# Altium footprint library Intelliclone.PcbLib: 372 footprints (part 7 of 24)
Each footprint in its own frame and in the unit in brackets; x right, y up, seen from the top. Pads: shape width x height; smd on the part's side, far side on the other; paste and mask are expansions set on the pad; w line width, h text height; cw(c..) or ccw(c..) is an arc to the next point about the centre after c.
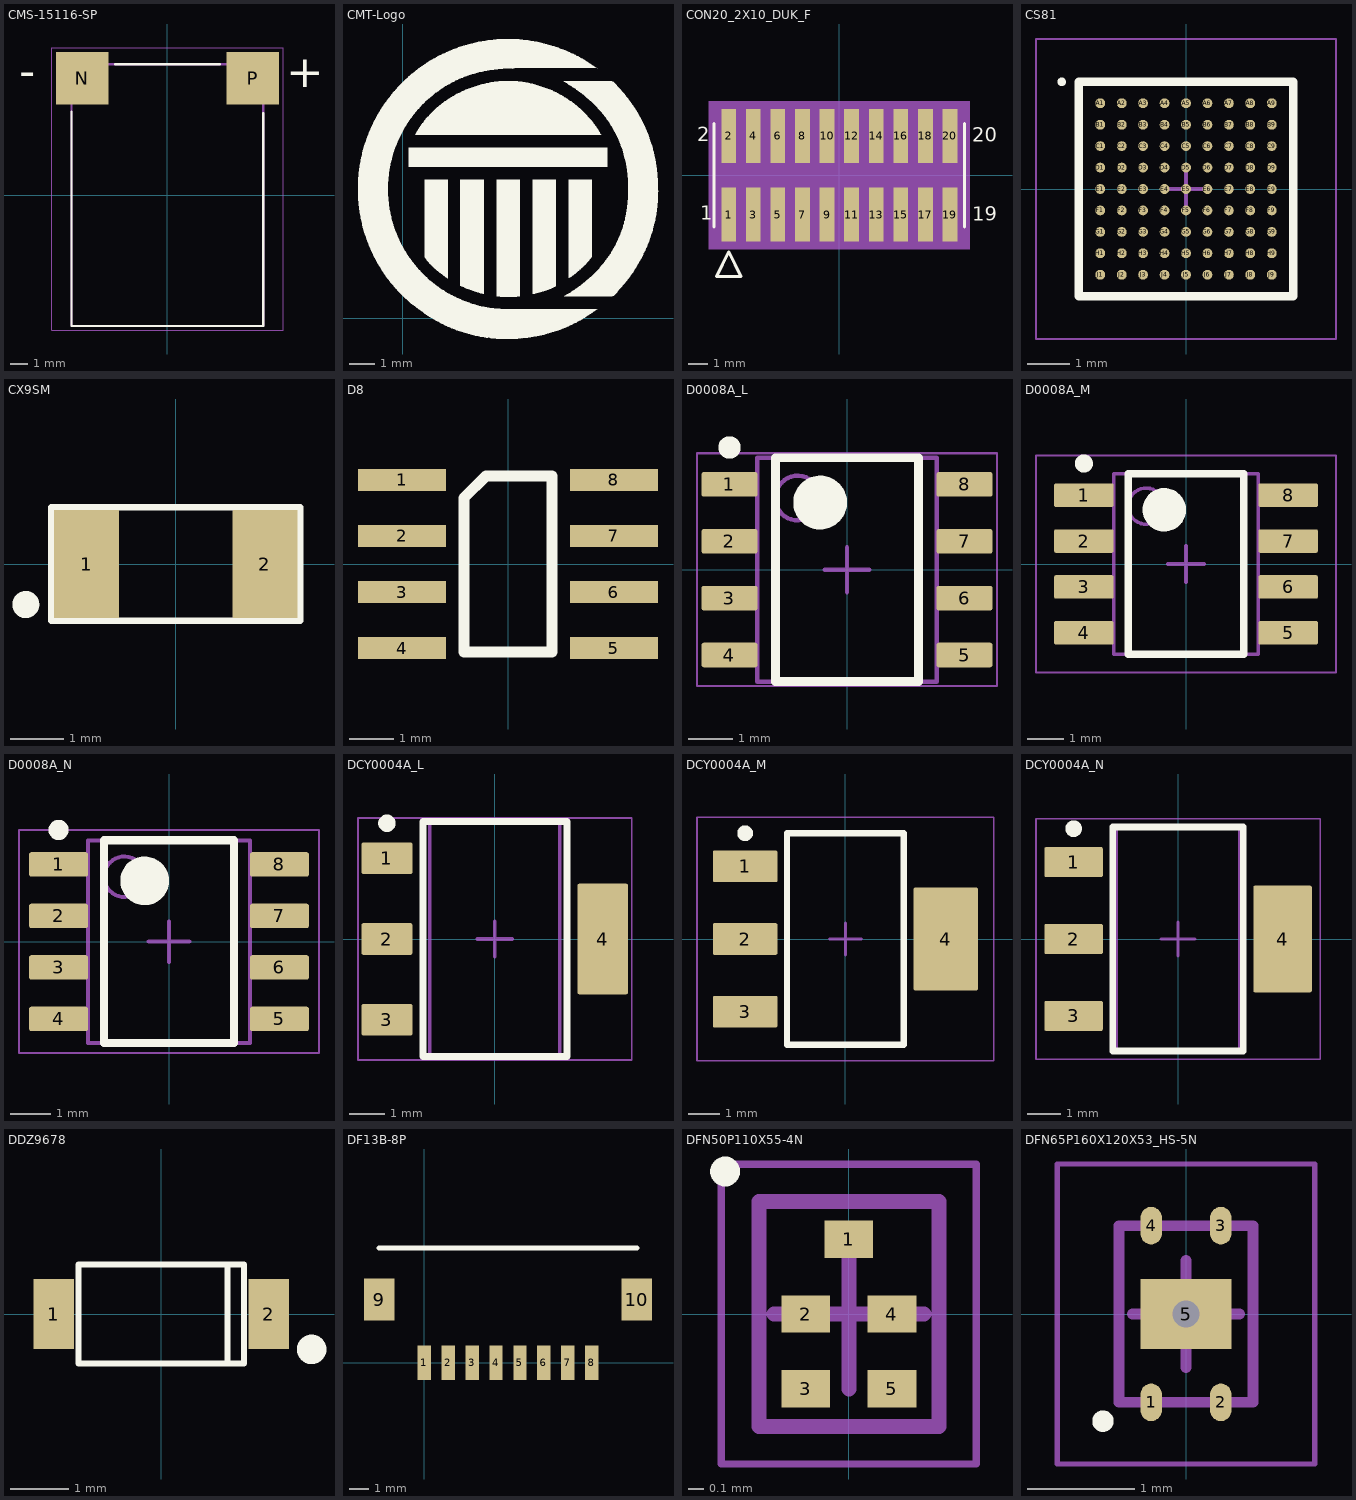
[diagram p6: the footprints below, top view; thin cyan lines are the x and y axes]

## CMS-15116-SP [mm] "SPEAKER, 15 X 11 MM, 3 MM DEEP"
pads (2):
  rect 3x3 smd paste-100: N(-4.89,6.7) P(4.89,6.7)
Top Overlay:
  lines w0.127: -5.5,4.8 -5.5,-7.5 5.5,-7.5 5.5,4.7 ; -3,7.5 3,7.5
  text "+" at 6.817,6.196 h1.88
  text "-" at -8.509,6.223 h1.88
Mechanical 4:
  lines w0.127: -5.5,-7.5 5.5,-7.5 ; -5.5,-7.5 -5.5,7.5 ; -5.5,-7.5 5.5,-7.5 ; -5.5,-7.5 -5.5,7.5 ; -5.5,7.5 5.5,7.5 ; -5.5,7.5 5.5,7.5 ; 5.5,-7.5 5.5,7.5 ; 5.5,-7.5 5.5,7.5
Mechanical 16:
  lines w0.05: -6.64,-7.75 6.64,-7.75 6.64,8.45 -6.64,8.45 -6.64,-7.75
3D body "CUI_CMS-15116-SP.step": height 3, standoff -0.23, extent -5.539,-7.493 5.461,7.507
3D body: height 1.45, standoff 0, extent -2.032,-0.635 -2.032,-0.635

## CMT-Logo [mm] "SBT DXF logo"
Top Overlay:
  drawing of 19 lines, arcs and shapes, not listed

## CON20_2X10_DUK_F [mil]
pads (20):
  rect 30x110 smd paste+0 mask+0: 1(-225,-80) 2(-225,80) 3(-175,-80) 4(-175,80) 5(-125,-80) 6(-125,80) 7(-75,-80) 8(-75,80) 9(-25,-80) 10(-25,80) 11(25,-80) 12(25,80) 13(75,-80) 14(75,80) 15(125,-80) 16(125,80) 17(175,-80) 18(175,80) 19(225,-80) 20(225,80)
Top Overlay:
  region: -220,-107.5 -230,-107.5 -230,-122.5 -220,-122.5
  region: 30,-107.5 20,-107.5 20,-122.5 30,-122.5
  lines w6: -255,-105 -255,105 ; 255,-105 255,105 ; -249.8,-205.97 -199.8,-205.97 -224.8,-155.97 -249.8,-205.97
  text "19" at 270.63,-103.03 h50
  text "20" at 270.63,57.95 h50
  text "1" at -283.15,-101.06 h50
  text "2" at -289.37,59.06 h50
Mechanical 5:
  region: 265,-150 -265,-150 -265,150 265,150
Mechanical 13:
  lines w1: -250,-100 -250,100 250,100 250,-100 -250,-100 ; -249.8,-205.97 -199.8,-205.97 -224.8,-155.97 -249.8,-205.97
  text "19" at 272.64,-100.39 h50
  text "20" at 272.64,57.95 h50
  text "1" at -283.15,-101.06 h50
  text "2" at -288.39,58.07 h50
Mechanical 15:
  region: 250,-100 -250,-100 -250,100 250,100
  region: -233,-100 -250,-100 -250,100 -233,100 -233,135 233,135 233,100 250,100 250,-100 233,-100 233,-135 -233,-135
  lines w6: -250,-100 -233,-100 -233,-135 233,-135 233,-100 250,-100 250,100 233,100 233,135 -233,135 -233,100 -250,100 -250,-100
3D body: height 10, standoff 0, extent 0,0 10,10
3D body "FTSH-110-01-F-DV-007-K.stp": height 225, standoff -16, extent -249.99,-114.99 250.01,115

## CS81 [mm] "BGA, 81-Leads, Body 5x5mm, Pitch 0.5mm"
height 0.8
pads (81):
  round 0.23 smd: A1(-2,2) A2(-1.5,2) A3(-1,2) A4(-0.5,2) A5(0,2) A6(0.5,2) A7(1,2) A8(1.5,2) A9(2,2) B1(-2,1.5) B2(-1.5,1.5) B3(-1,1.5) B4(-0.5,1.5) B5(0,1.5) B6(0.5,1.5) B7(1,1.5) B8(1.5,1.5) B9(2,1.5) C1(-2,1) C2(-1.5,1) C3(-1,1) C4(-0.5,1) C5(0,1) C6(0.5,1) C7(1,1) C8(1.5,1) C9(2,1) D1(-2,0.5) D2(-1.5,0.5) D3(-1,0.5) D4(-0.5,0.5) D5(0,0.5) D6(0.5,0.5) D7(1,0.5) D8(1.5,0.5) D9(2,0.5) E1(-2,0) E2(-1.5,0) E3(-1,0) E4(-0.5,0) E5(0,0) E6(0.5,0) E7(1,0) E8(1.5,0) E9(2,0) F1(-2,-0.5) F2(-1.5,-0.5) F3(-1,-0.5) F4(-0.5,-0.5) F5(0,-0.5) F6(0.5,-0.5) F7(1,-0.5) F8(1.5,-0.5) F9(2,-0.5) G1(-2,-1) G2(-1.5,-1) G3(-1,-1) G4(-0.5,-1) G5(0,-1) G6(0.5,-1) G7(1,-1) G8(1.5,-1) G9(2,-1) H1(-2,-1.5) H2(-1.5,-1.5) H3(-1,-1.5) H4(-0.5,-1.5) H5(0,-1.5) H6(0.5,-1.5) H7(1,-1.5) H8(1.5,-1.5) H9(2,-1.5) J1(-2,-2) J2(-1.5,-2) J3(-1,-2) J4(-0.5,-2) J5(0,-2) J6(0.5,-2) J7(1,-2) J8(1.5,-2) J9(2,-2)
Top Overlay:
  circle w0.1: c-2.9,2.5 r0.05
  lines w0.2: -2.5,-2.5 -2.5,2.5 2.5,2.5 2.5,-2.5 -2.5,-2.5
Mechanical 13:
  lines w0.1: -2.5,-2.5 -2.5,2.5 2.5,2.5 2.5,-2.5 -2.5,-2.5
Mechanical 15:
  lines w0.05: -3.5,-3.5 -3.5,3.5 3.5,3.5 3.5,-3.5 -3.5,-3.5
  lines w0.1: -0.5,0 0.5,0 ; 0,-0.5 0,0.5
3D body: height 0.8, standoff 0.05, extent -2.5,-2.5 2.5,2.5

## CX9SM [mil] "Crystal, 2 leads, 4.1mm x 1.5mm, SMD"
pads (2):
  rect 48x80 smd: 1(-66,0) 2(66,0)
Top Overlay:
  circle w10: c-111,-30 r5
  lines w5: -92,-42 92,-42 92,42 -92,42 -92,-42
3D body: height 34, standoff 4, extent -85,-34.05 85,34.05

## D8 [mil]
pads (8):
  rect 78.7x19.7 smd: 1(-94.5,75) 2(-94.5,25) 3(-94.5,-25) 4(-94.5,-75) 5(94.5,-75) 6(94.5,-25) 7(94.5,25) 8(94.5,75)
Top Overlay:
  lines w9.8: -39.4,-78.7 -39.4,59.1 -19.7,78.7 39.4,78.7 39.4,-78.7 -39.4,-78.7
3D body: height 34, standoff 4, extent -40,-80 40,80

## D0008A_L [mm] "SOIC, 8-Leads, Body 5x4mm, Pitch 1.27mm, IPC High Density"
height 1.75
pads (8):
  rrect18% 1.25x0.55 smd: 1(-2.625,1.905) 2(-2.625,0.635) 3(-2.625,-0.635) 4(-2.625,-1.905) 5(2.625,-1.905) 6(2.625,-0.635) 7(2.625,0.635) 8(2.625,1.905)
Top Overlay:
  circle w0.25: c-2.625,2.73 r0.125
  circle w0.6: c-0.6,1.5 r0.3
  lines w0.2: -1.6,-2.5 -1.6,2.5 1.6,2.5 1.6,-2.5 -1.6,-2.5
Mechanical 1:
  text ".Designator" at -1.397,-0.254 h0.6
Mechanical 13:
  circle w0.1: c-1.1,1.6 r0.5
  lines w0.1: -2,-2.5 -2,2.5 2,2.5 2,-2.5 -2,-2.5
Mechanical 15:
  lines w0.05: -3.35,-2.6 -3.35,2.6 3.35,2.6 3.35,-2.6 -3.35,-2.6
  lines w0.1: -0.5,0 0.5,0 ; 0,-0.5 0,0.5
3D body "SOIC-8akaD0008AakaM08A.stp": height 1.63, standoff 0, extent -3,-2.45 3,2.45

## D0008A_M [mm] "SOIC, 8-Leads, Body 5x4mm, Pitch 1.27mm, IPC Low Density"
height 1.75
pads (8):
  rrect15% 1.65x0.65 smd: 1(-2.825,1.905) 2(-2.825,0.635) 3(-2.825,-0.635) 4(-2.825,-1.905) 5(2.825,-1.905) 6(2.825,-0.635) 7(2.825,0.635) 8(2.825,1.905)
Top Overlay:
  circle w0.25: c-2.825,2.78 r0.125
  circle w0.6: c-0.6,1.5 r0.3
  lines w0.2: -1.6,-2.5 -1.6,2.5 1.6,2.5 1.6,-2.5 -1.6,-2.5
Mechanical 1:
  text ".Designator" at -1.397,-0.254 h0.6
Mechanical 13:
  circle w0.1: c-1.1,1.6 r0.5
  lines w0.1: -2,-2.5 -2,2.5 2,2.5 2,-2.5 -2,-2.5
Mechanical 15:
  lines w0.05: -4.15,-3 -4.15,3 4.15,3 4.15,-3 -4.15,-3
  lines w0.1: -0.5,0 0.5,0 ; 0,-0.5 0,0.5
3D body "SOIC-8akaD0008AakaM08A.stp": height 1.63, standoff 0, extent -3,-2.45 3,2.45

## D0008A_N [mm] "SOIC, 8-Leads, Body 5x4mm, Pitch 1.27mm, IPC Medium Density"
height 1.75
pads (8):
  rrect17% 1.45x0.6 smd: 1(-2.725,1.905) 2(-2.725,0.635) 3(-2.725,-0.635) 4(-2.725,-1.905) 5(2.725,-1.905) 6(2.725,-0.635) 7(2.725,0.635) 8(2.725,1.905)
Top Overlay:
  circle w0.6: c-0.6,1.5 r0.3
  circle w0.25: c-2.725,2.755 r0.125
  lines w0.2: -1.6,-2.5 1.6,-2.5 1.6,2.5 -1.6,2.5 -1.6,-2.5
Mechanical 1:
  text ".Designator" at -1.397,-0.254 h0.6
Mechanical 13:
  circle w0.1: c-1.1,1.6 r0.5
  lines w0.1: -2,-2.5 2,-2.5 2,2.5 -2,2.5 -2,-2.5
Mechanical 15:
  lines w0.05: -3.7,-2.75 3.7,-2.75 3.7,2.75 -3.7,2.75 -3.7,-2.75
  lines w0.1: -0.5,0 0.5,0 ; 0,-0.5 0,0.5
3D body "SOIC-8akaD0008AakaM08A.stp": height 1.63, standoff 0, extent -3,-2.45 3,2.45

## DCY0004A_L [mm] "SOT223, 4-Leads, Body 6.7x3.7mm, Pitch 2.3mm, IPC High Density"
height 1.8
pads (4):
  rrect11% 1.45x0.9 smd: 1(-3.075,2.3) 2(-3.075,0) 3(-3.075,-2.3)
  rrect7% 1.45x3.15 smd: 4(3.075,0)
Top Overlay:
  circle w0.25: c-3.075,3.3 r0.125
  lines w0.2: -2.05,-3.35 -2.05,3.35 2.05,3.35 2.05,-3.35 -2.05,-3.35
Mechanical 1:
  text ".Designator" at -1.651,-0.381 h0.8
Mechanical 13:
  lines w0.1: -1.85,-3.35 -1.85,3.35 1.85,3.35 1.85,-3.35 -1.85,-3.35
Mechanical 15:
  lines w0.05: -3.9,-3.45 -3.9,3.45 3.9,3.45 3.9,-3.45 -3.9,-3.45
  lines w0.1: -0.5,0 0.5,0 ; 0,-0.5 0,0.5
3D body "SOT-223.stp": height 1.62, standoff -0.03, extent -3.5,-3.25 3.5,3.25

## DCY0004A_M [mm] "SOT223, 4-Leads, Body 6.7x3.7mm, Pitch 2.3mm, IPC Low Density"
height 1.8
pads (4):
  rrect10% 2.05x1 smd: 1(-3.175,2.3) 2(-3.175,0) 3(-3.175,-2.3)
  rrect5% 2.05x3.25 smd: 4(3.175,0)
Top Overlay:
  circle w0.25: c-3.175,3.35 r0.125
  lines w0.2: -1.85,-3.35 1.85,-3.35 1.85,3.35 -1.85,3.35 -1.85,-3.35
Mechanical 1:
  text ".Designator" at -1.651,-0.381 h0.8
Mechanical 13:
  lines w0.1: -1.85,-3.35 1.85,-3.35 1.85,3.35 -1.85,3.35 -1.85,-3.35
Mechanical 15:
  lines w0.05: -4.7,-3.85 4.7,-3.85 4.7,3.85 -4.7,3.85 -4.7,-3.85
  lines w0.1: -0.5,0 0.5,0 ; 0,-0.5 0,0.5
3D body "SOT-223.stp": height 1.62, standoff -0.03, extent -3.5,-3.25 3.5,3.25

## DCY0004A_N [mm] "SOT223, 4-Leads, Body 6.7x3.7mm, Pitch 2.3mm, IPC Medium Density"
height 1.8
pads (4):
  rrect11% 1.75x0.9 smd: 1(-3.125,2.3) 2(-3.125,0) 3(-3.125,-2.3)
  rrect6% 1.75x3.2 smd: 4(3.125,0)
Top Overlay:
  circle w0.25: c-3.125,3.3 r0.125
  lines w0.2: -1.95,-3.35 1.95,-3.35 1.95,3.35 -1.95,3.35 -1.95,-3.35
Mechanical 1:
  text ".Designator" at -1.651,-0.254 h0.8
Mechanical 13:
  lines w0.1: -1.85,-3.35 1.85,-3.35 1.85,3.35 -1.85,3.35 -1.85,-3.35
Mechanical 15:
  lines w0.05: -4.25,-3.6 4.25,-3.6 4.25,3.6 -4.25,3.6 -4.25,-3.6
  lines w0.1: -0.5,0 0.5,0 ; 0,-0.5 0,0.5
3D body "SOT-223.stp": height 1.62, standoff -0.03, extent -3.5,-3.25 3.5,3.25

## DDZ9678 [mm]
height 1.35
pads (2):
  rect 0.7x1.2 smd: 1(-1.85,0) 2(1.85,0)
Top Overlay:
  circle w0.254: c2.591,-0.61 r0.127
  lines w0.102: 1.143,-0.85 1.143,0.85 ; -1.425,-0.85 -1.425,0.85 1.425,0.85 1.425,-0.85 -1.425,-0.85
3D body: height 1.4, standoff 0.05, extent -1.397,-0.889 1.397,0.889

## DF13B-8P [mm] "CONN HEADER 8POS 1.25MM"
pads (10):
  rect 0.7x1.8 smd: 1(0,0) 2(1.25,0) 3(2.5,0) 4(3.75,0) 5(5,0) 6(6.25,0) 7(7.5,0) 8(8.75,0)
  rect 1.6x2.2 smd: 9(-2.35,3.3) 10(11.1,3.3)
Top Overlay:
  lines w0.254: -2.35,6 11.1,6
3D body: height 5.8, standoff 0.05, extent -2.464,-0.051 11.176,6

## DFN50P110X55-4N [mm] "DFN, 4-Leads, Body 1.40x1.10mm, Pitch 0.50mm, IPC Medium Density"
height 0.55
pads (5):
  rect 0.325x0.25 smd mask+0.05: 1(0,0.5) 2(-0.288,0) 3(-0.288,-0.5) 4(0.288,0) 5(0.288,-0.5)
Top Overlay:
  circle w0.1: c-0.825,0.95 r0.05
Mechanical 13:
  lines w0.1: -0.6,-0.75 0.6,-0.75 0.6,0.75 -0.6,0.75 -0.6,-0.75
Mechanical 15:
  lines w0.05: -0.85,-1 0.85,-1 0.85,1 -0.85,1 -0.85,-1
  lines w0.1: -0.5,0 0.5,0 ; 0,-0.5 0,0.5
3D body: height 0.55, standoff 0.05, extent -0.6,-0.75 0.6,0.75

## DFN65P160X120X53_HS-5N [mm] "DFN, 4-Leads, Body 1.60x1.20mm, Pitch 0.65mm, Thermal Pad 0.65x0.85mm, IPC Medium Density"
height 0.53
pads (5):
  oval 0.2x0.35 smd: 1(-0.325,-0.825) 2(0.325,-0.825) 3(0.325,0.825) 4(-0.325,0.825)
  rect 0.85x0.65 smd: 5(0,0)
via 0,0 diameter 0.559 hole 0.254
Top Overlay:
  circle w0.1: c-0.775,-1 r0.05
Mechanical 13:
  lines w0.1: -0.625,-0.825 0.625,-0.825 0.625,0.825 -0.625,0.825 -0.625,-0.825
Mechanical 15:
  lines w0.05: -1.2,-1.4 1.2,-1.4 1.2,1.4 -1.2,1.4 -1.2,-1.4
  lines w0.1: -0.5,0 0.5,0 ; 0,-0.5 0,0.5
3D body: height 0.53, standoff 0.05, extent -0.625,-0.825 0.625,0.825